# Altium footprint library Standard.PcbLib: 154 footprints (part 1 of 10)
Each footprint in its own frame and in the unit in brackets; x right, y up, seen from the top. Pads: shape width x height; smd on the part's side, far side on the other; paste and mask are expansions set on the pad; w line width, h text height; cw(c..) or ccw(c..) is an arc to the next point about the centre after c.
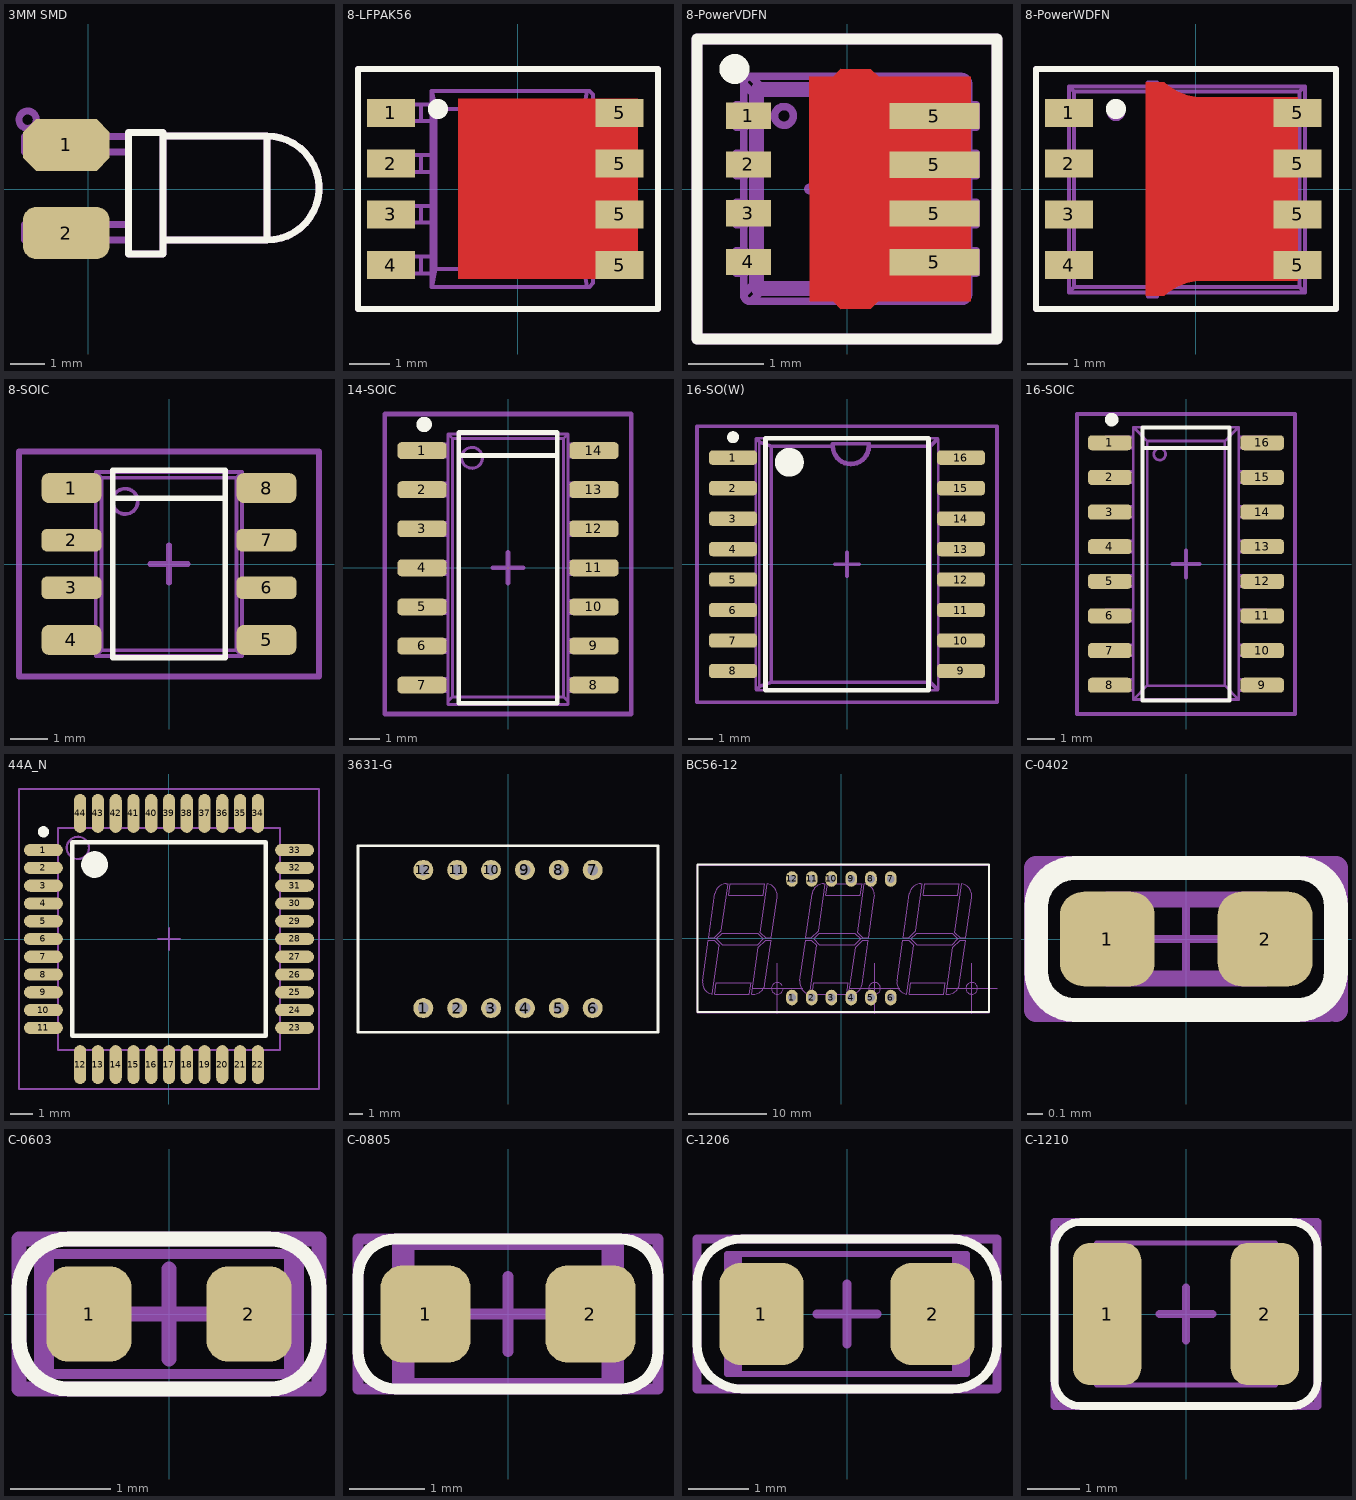
[diagram p0: the footprints below, top view; thin cyan lines are the x and y axes]

## 3MM SMD [mm]
pads (2):
  oct 2.5x1.5 smd: 1(-0.635,1.27)
  rrect50% 2.5x1.5 smd: 2(-0.635,-1.27)
Top Overlay:
  lines w0.2: 2.155,-1.475 5.155,-1.475 ; 2.155,1.525 5.155,1.525 ; 5.155,-1.475 ccw(c5.155,0.025) 5.155,1.525 ; 5.155,-1.475 5.155,1.525 ; 1.155,-1.875 2.155,-1.875 2.155,1.625 1.155,1.625 1.155,-1.875
Top Assembly:
  circle w0.2: c-1.75,2 r0.25
  lines w0.2: 1.155,-1.47 -1.845,-1.47 -1.845,-1.02 1.155,-1.02 ; 1.155,1.07 -1.845,1.07 -1.845,1.52 1.155,1.52 ; 2.155,-1.475 5.155,-1.475 ; 2.155,1.525 5.155,1.525 ; 5.155,-1.475 ccw(c5.155,0.025) 5.155,1.525 ; 5.155,-1.475 5.155,1.525 ; 1.155,-1.875 2.155,-1.875 2.155,1.625 1.155,1.625 1.155,-1.875
3D body "CircuitWorks-LED DIP 3MM.step": height 2.15, standoff -1.65, extent -2,-1.9 6.5,1.6

## 8-LFPAK56 [mm]
pads (8):
  rect 1.2x0.7 smd: 1(-3.175,1.905) 2(-3.175,0.635) 3(-3.175,-0.635) 4(-3.175,-1.905) 5(2.54,-1.905) 5(2.54,-0.635) 5(2.54,0.635) 5(2.54,1.905)
Top Layer:
  region: -1.5,2.25 3,2.25 3,-2.25 -1.5,-2.25
Top Overlay:
  circle w0.4: c-2,2 r0.05
  lines w0.15: -4,-3 3.5,-3 3.5,3 -4,3 -4,-3
Top Assembly:
  circle w0.1: c-0.208,1.503 r0.338
  lines w0.1: 1.877,-1.397 1.877,-2.355 1.785,-2.447 1.73,-2.447 ; 1.877,-0.597 1.877,0.603 ; 1.877,1.403 1.877,2.36 1.785,2.453 1.73,2.453 ; -2.839,-2.112 -2.751,-2.112 ; -2.839,-2.112 -3.208,-2.112 -3.208,-1.692 -2.839,-1.692 ; -2.839,-2.112 -2.839,-1.692 ; -2.839,-1.692 -2.751,-1.692 ; -2.839,-0.842 -2.751,-0.842 ; -2.839,-0.842 -3.208,-0.842 -3.208,-0.422 -2.839,-0.422 ; -2.839,-0.842 -2.839,-0.422 ; -2.839,-0.422 -2.751,-0.422 ; -2.839,0.428 -2.751,0.428 ; -2.839,0.428 -3.208,0.428 -3.208,0.848 -2.839,0.848 ; -2.839,0.428 -2.839,0.848 ; -2.839,0.848 -2.751,0.848 ; -2.839,1.698 -2.751,1.698 ; -2.839,1.698 -3.208,1.698 -3.208,2.118 -2.839,2.118 ; -2.839,1.698 -2.839,2.118 ; -2.839,2.118 -2.751,2.118 ; -2.751,-2.112 -2.714,-2.112 ; -2.751,-2.112 -2.751,-1.692 ; -2.751,-1.692 -2.714,-1.692 ; -2.751,-0.842 -2.714,-0.842 ; -2.751,-0.842 -2.751,-0.422 ; -2.751,-0.422 -2.714,-0.422 ; -2.751,0.428 -2.714,0.428 ; -2.751,0.428 -2.751,0.848 ; -2.751,0.848 -2.714,0.848 ; -2.751,1.698 -2.714,1.698 ; -2.751,1.698 -2.751,2.118 ; -2.751,2.118 -2.714,2.118 ; -2.714,-2.112 -2.424,-2.112 ; -2.714,-2.112 -2.714,-1.692 ; -2.714,-1.692 -2.424,-1.692 ; -2.714,-0.842 -2.424,-0.842 ; -2.714,-0.842 -2.714,-0.422 ; -2.714,-0.422 -2.424,-0.422 ; -2.714,0.428 -2.424,0.428 ; -2.714,0.428 -2.714,0.848 ; -2.714,0.848 -2.424,0.848 ; -2.714,1.698 -2.424,1.698 ; -2.714,1.698 -2.714,2.118 ; -2.714,2.118 -2.424,2.118 ; -2.424,-2.112 -2.158,-2.112 ; -2.424,-2.112 -2.424,-1.692 ; -2.424,-1.692 -2.158,-1.692 ; -2.424,-0.842 -2.158,-0.842 ; -2.424,-0.842 -2.424,-0.422 ; -2.424,-0.422 -2.158,-0.422 ; -2.424,0.428 -2.158,0.428 ; -2.424,0.428 -2.424,0.848 ; -2.424,0.848 -2.158,0.848 ; -2.424,1.698 -2.158,1.698 ; -2.424,1.698 -2.424,2.118 ; -2.424,2.118 -2.158,2.118 ; -2.158,-2.112 -2.158,-2.447 -2.145,-2.447 ; -2.158,-2.112 -2.158,-1.692 ; -2.158,-1.692 -2.158,-0.842 ; -2.158,-0.842 -2.158,-0.422 ; -2.158,-0.422 -2.158,0.428 ; -2.158,0.428 -2.158,0.848 ; -2.158,0.848 -2.158,1.698 ; -2.158,1.698 -2.158,2.118 ; -2.158,2.118 -2.158,2.453 -2.145,2.453 ; -2.145,-2.447 -2.065,-2.001 ; -2.145,-2.447 1.73,-2.447 ; -2.145,2.453 -2.065,2.006 ; -2.145,2.453 1.73,2.453 ; -2.065,-2.001 1.65,-2.001 ; -2.065,-2.001 -2.065,2.006 ; -2.065,2.006 1.65,2.006 ; 1.65,-2.001 1.65,2.006 ; 1.65,-2.001 1.73,-2.447 ; 1.65,2.006 1.73,2.453 ; 1.82,-1.397 1.82,-0.597 1.892,-0.597 1.892,0.603 1.82,0.603 1.82,1.403 2.092,1.403 2.092,2.103 2.342,2.103 2.792,1.653 2.792,-1.647 2.342,-2.097 2.092,-2.097 2.092,-1.397 1.82,-1.397
Top Component Outline:
  lines w0.15: -0.5,0 0.5,0 ; 0,-0.5 0,0.5 ; -4,-3 -4,3 3.5,3 3.5,-3 -4,-3
3D body "User Library-LFPAK-1.step": height 1.1, standoff 0, extent -3.25,-2.45 2.75,2.45

## 8-PowerVDFN [mm]
pads (8):
  rect 0.6x0.35 smd: 1(-1.316,0.977) 2(-1.316,0.327) 3(-1.316,-0.323) 4(-1.316,-0.973)
  rect 1.2x0.35 smd: 5(1.166,-0.977) 5(1.166,-0.327) 5(1.166,0.323) 5(1.166,0.973)
Top Layer:
  region: -0.5,1.5 -0.186,1.5 -0.086,1.6 0.318,1.6 0.417,1.5 1.65,1.5 1.65,-1.5 0.417,-1.5 0.318,-1.6 -0.086,-1.6 -0.187,-1.5 -0.5,-1.5
Top Overlay:
  circle w0.2: c-1.5,1.6 r0.1
  lines w0.15: -2,-2 2,-2 2,2 -2,2 -2,-2
Top Assembly:
  drawing of 483 lines, arcs and shapes, not listed
Top Component Outline:
  lines w0.15: -0.5,0 0.5,0 ; 0,-0.5 0,0.5 ; -2,-2 -2,2 2,2 2,-2 -2,-2
3D body "User Library-DFN8_3x3_0_65Pitch.step": height 0.8, standoff 0, extent -1.465,-1.548 1.735,1.552

## 8-PowerWDFN [mm]
pads (8):
  rect 1.2x0.7 smd: 1(-3.175,1.905) 2(-3.175,0.635) 3(-3.175,-0.635) 4(-3.175,-1.905) 5(2.54,-1.905) 5(2.54,-0.635) 5(2.54,0.635) 5(2.54,1.905)
Top Layer:
  region: -1.25,2.669 -0.792,2.669 -0.691,2.583 -0.467,2.443 -0.221,2.346 0.038,2.297 0.171,2.291 2.549,2.291 2.549,-2.291 0.171,-2.291 0.038,-2.297 -0.221,-2.346 -0.467,-2.443 -0.691,-2.583 -0.792,-2.669 -1.25,-2.669
Top Overlay:
  circle w0.4: c-2,2 r0.05
  lines w0.15: -4,-3 -4,3 3.5,3 3.5,-3 -4,-3
Top Assembly:
  circle w0.254: c-2,1.925 r0.1
  lines w0.1: -3.18,-2.04 -3.305,-2.04 -3.305,-1.79 -3.18,-1.79 ; -3.18,-0.77 -3.305,-0.77 -3.305,-0.52 -3.18,-0.52 ; -3.18,0.5 -3.305,0.5 -3.305,0.75 -3.18,0.75 ; -3.18,1.77 -3.305,1.77 -3.305,2.02 -3.18,2.02 ; -1.205,-2.585 -1.205,-2.685 -0.98,-2.685 -0.98,-2.585 ; -1.205,2.565 -1.205,2.665 -0.98,2.665 -0.98,2.565 ; 2.72,-2.04 2.845,-2.04 2.845,-1.79 2.72,-1.79 ; 2.72,-0.77 2.845,-0.77 2.845,-0.52 2.72,-0.52 ; 2.72,0.5 2.845,0.5 2.845,0.75 2.72,0.75 ; 2.72,1.77 2.845,1.77 2.845,2.02 2.72,2.02 ; -3.18,-2.585 -3.048,-2.453 ; -3.18,-2.585 -3.18,2.565 ; -3.18,-2.585 2.72,-2.585 ; -3.18,2.565 -3.048,2.433 ; -3.18,2.565 2.72,2.565 ; -3.048,-2.453 2.588,-2.453 ; -3.048,-2.453 -3.048,2.433 ; -3.048,2.433 2.588,2.433 ; 2.588,-2.453 2.588,2.433 ; 2.588,-2.453 2.72,-2.585 ; 2.588,2.433 2.72,2.565 ; 2.72,-2.585 2.72,2.565
Top Component Outline:
  lines w0.15: -0.5,0 0.5,0 ; 0,-0.5 0,0.5 ; -4,-3 3.5,-3 3.5,3 -4,3 -4,-3
3D body "User Library-TDSON-8-1.step": height 1, standoff 0, extent -3.329,-2.675 2.821,2.675

## 8-SOIC [mm] "SOIC, 8-Leads, Body 4,90x3,90mm, Pitch 1,27mm, IPC Medium Density"
height 1.75
pads (8):
  rrect50% 1.6x0.8 smd: 1(-2.6,2.025) 4(-2.6,-2.025) 5(2.6,-2.025) 8(2.6,2.025)
  rrect50% 1.6x0.6 smd: 2(-2.6,0.635) 3(-2.6,-0.635) 6(2.6,-0.635) 7(2.6,0.635)
Top Overlay:
  lines w0.15: -1.5,1.75 1.5,1.75 ; -1.5,-2.5 -1.5,2.5 1.5,2.5 1.5,-2.5 -1.5,-2.5
Top Assembly:
  circle w0.1: c-1.17,1.67 r0.338
  lines w0.1: -2.631,-2.115 -2.543,-2.115 ; -2.631,-2.115 -3,-2.115 -3,-1.695 -2.631,-1.695 ; -2.631,-2.115 -2.631,-1.695 ; -2.631,-1.695 -2.543,-1.695 ; -2.631,-0.845 -2.543,-0.845 ; -2.631,-0.845 -3,-0.845 -3,-0.425 -2.631,-0.425 ; -2.631,-0.845 -2.631,-0.425 ; -2.631,-0.425 -2.543,-0.425 ; -2.631,0.425 -2.543,0.425 ; -2.631,0.425 -3,0.425 -3,0.845 -2.631,0.845 ; -2.631,0.425 -2.631,0.845 ; -2.631,0.845 -2.543,0.845 ; -2.631,1.695 -2.543,1.695 ; -2.631,1.695 -3,1.695 -3,2.115 -2.631,2.115 ; -2.631,1.695 -2.631,2.115 ; -2.631,2.115 -2.543,2.115 ; -2.543,-2.115 -2.403,-2.115 ; -2.543,-2.115 -2.543,-1.695 ; -2.543,-1.695 -2.403,-1.695 ; -2.543,-0.845 -2.403,-0.845 ; -2.543,-0.845 -2.543,-0.425 ; -2.543,-0.425 -2.403,-0.425 ; -2.543,0.425 -2.403,0.425 ; -2.543,0.425 -2.543,0.845 ; -2.543,0.845 -2.403,0.845 ; -2.543,1.695 -2.403,1.695 ; -2.543,1.695 -2.543,2.115 ; -2.543,2.115 -2.403,2.115 ; -2.403,-2.115 -2.113,-2.115 ; -2.403,-2.115 -2.403,-1.695 ; -2.403,-1.695 -2.113,-1.695 ; -2.403,-0.845 -2.113,-0.845 ; -2.403,-0.845 -2.403,-0.425 ; -2.403,-0.425 -2.113,-0.425 ; -2.403,0.425 -2.113,0.425 ; -2.403,0.425 -2.403,0.845 ; -2.403,0.845 -2.113,0.845 ; -2.403,1.695 -2.113,1.695 ; -2.403,1.695 -2.403,2.115 ; -2.403,2.115 -2.113,2.115 ; -2.113,-2.115 -1.95,-2.115 ; -2.113,-2.115 -2.113,-1.695 ; -2.113,-1.695 -1.95,-1.695 ; -2.113,-0.845 -1.95,-0.845 ; -2.113,-0.845 -2.113,-0.425 ; -2.113,-0.425 -1.95,-0.425 ; -2.113,0.425 -1.95,0.425 ; -2.113,0.425 -2.113,0.845 ; -2.113,0.845 -1.95,0.845 ; -2.113,1.695 -1.95,1.695 ; -2.113,1.695 -2.113,2.115 ; -2.113,2.115 -1.95,2.115 ; -1.95,-2.45 -1.801,-2.301 ; -1.95,-2.45 -1.95,-2.115 ; -1.95,-2.45 1.95,-2.45 ; -1.95,-2.115 -1.95,-1.695 ; -1.95,-1.695 -1.95,-0.845 ; -1.95,-0.845 -1.95,-0.425 ; -1.95,-0.425 -1.95,0.425 ; -1.95,0.425 -1.95,0.845 ; -1.95,0.845 -1.95,1.695 ; -1.95,1.695 -1.95,2.115 ; -1.95,2.115 -1.95,2.45 ; -1.95,2.45 1.95,2.45 ; -1.95,2.45 -1.801,2.301 ; -1.801,-2.301 -1.801,2.301 ; -1.801,-2.301 1.801,-2.301 ; -1.801,2.301 1.801,2.301 ; 1.801,-2.301 1.801,2.301 ; 1.801,-2.301 1.95,-2.45 ; 1.801,2.301 1.95,2.45 ; 1.95,-2.45 1.95,-2.115 ; 1.95,-2.115 1.95,-1.695 ; 1.95,-2.115 2.113,-2.115 ; 1.95,-1.695 1.95,-0.845 ; 1.95,-1.695 2.113,-1.695 ; 1.95,-0.845 1.95,-0.425 ; 1.95,-0.845 2.113,-0.845 ; 1.95,-0.425 1.95,0.425 ; 1.95,-0.425 2.113,-0.425 ; 1.95,0.425 1.95,0.845 ; 1.95,0.425 2.113,0.425 ; 1.95,0.845 1.95,1.695 ; 1.95,0.845 2.113,0.845 ; 1.95,1.695 1.95,2.115 ; 1.95,1.695 2.113,1.695 ; 1.95,2.115 1.95,2.45 ; 1.95,2.115 2.113,2.115 ; 2.113,-2.115 2.403,-2.115 ; 2.113,-2.115 2.113,-1.695 ; 2.113,-1.695 2.403,-1.695 ; 2.113,-0.845 2.403,-0.845 ; 2.113,-0.845 2.113,-0.425 ; 2.113,-0.425 2.403,-0.425 ; 2.113,0.425 2.403,0.425 ; 2.113,0.425 2.113,0.845 ; 2.113,0.845 2.403,0.845 ; 2.113,1.695 2.403,1.695 ; 2.113,1.695 2.113,2.115 ; 2.113,2.115 2.403,2.115 ; 2.403,-2.115 2.543,-2.115 ; 2.403,-2.115 2.403,-1.695 ; 2.403,-1.695 2.543,-1.695 ; 2.403,-0.845 2.543,-0.845 ; 2.403,-0.845 2.403,-0.425 ; 2.403,-0.425 2.543,-0.425 ; 2.403,0.425 2.543,0.425 ; 2.403,0.425 2.403,0.845 ; 2.403,0.845 2.543,0.845 ; 2.403,1.695 2.543,1.695 ; 2.403,1.695 2.403,2.115 ; 2.403,2.115 2.543,2.115 ; 2.543,-2.115 2.631,-2.115 ; 2.543,-2.115 2.543,-1.695 ; 2.543,-1.695 2.631,-1.695 ; 2.543,-0.845 2.631,-0.845 ; 2.543,-0.845 2.543,-0.425 ; 2.543,-0.425 2.631,-0.425 ; 2.543,0.425 2.631,0.425 ; 2.543,0.425 2.543,0.845 ; 2.543,0.845 2.631,0.845 ; 2.543,1.695 2.631,1.695 ; 2.543,1.695 2.543,2.115 ; 2.543,2.115 2.631,2.115 ; 2.631,-2.115 3,-2.115 3,-1.695 2.631,-1.695 ; 2.631,-2.115 2.631,-1.695 ; 2.631,-0.845 3,-0.845 3,-0.425 2.631,-0.425 ; 2.631,-0.845 2.631,-0.425 ; 2.631,0.425 3,0.425 3,0.845 2.631,0.845 ; 2.631,0.425 2.631,0.845 ; 2.631,1.695 3,1.695 3,2.115 2.631,2.115 ; 2.631,1.695 2.631,2.115
Top Component Outline:
  lines w0.15: -0.5,0 0.5,0 ; 0,-0.5 0,0.5 ; -4,-3 -4,3 4,3 4,-3 -4,-3
3D body "User Library-SOIC-8-1.step": height 1.75, standoff 0, extent -3,-2.45 3,2.45

## 14-SOIC [mm] "SOIC, 14-Leads, Body 8,65x3,90mm, Pitch 1,27mm, IPC Medium Density"
height 1.75
pads (14):
  rrect50% 1.6x0.55 smd: 1(-2.794,3.81) 2(-2.794,2.54) 3(-2.794,1.27) 4(-2.794,0) 5(-2.794,-1.27) 6(-2.794,-2.54) 7(-2.794,-3.81) 8(2.794,-3.81) 9(2.794,-2.54) 10(2.794,-1.27) 11(2.794,0) 12(2.794,1.27) 13(2.794,2.54) 14(2.794,3.81)
Top Overlay:
  circle w0.25: c-2.725,4.66 r0.125
  lines w0.15: -1.6,3.65 1.6,3.65 ; -1.6,-4.4 -1.6,4.4 1.6,4.4 1.6,-4.4 -1.6,-4.4
Top Assembly:
  drawing of 246 lines, arcs and shapes, not listed
Top Component Outline:
  lines w0.15: -0.5,0 0.5,0 ; 0,-0.5 0,0.5 ; -4,-4.75 -4,5 4,5 4,-4.75 -4,-4.75
3D body "User Library-SOIC-14.STEP": height 1.75, standoff 0, extent -3,-4.375 3,4.375

## 16-SO(W) [mm] "SOIC, 16-Leads, Body 10,30x7,50mm, Pitch 1,27mm, IPC Medium Density"
height 2.65
pads (16):
  rrect50% 2x0.6 smd: 1(-4.75,4.445) 2(-4.75,3.175) 3(-4.75,1.905) 4(-4.75,0.635) 5(-4.75,-0.635) 6(-4.75,-1.905) 7(-4.75,-3.175) 8(-4.75,-4.445) 9(4.75,-4.445) 10(4.75,-3.175) 11(4.75,-1.905) 12(4.75,-0.635) 13(4.75,0.635) 14(4.75,1.905) 15(4.75,3.175) 16(4.75,4.445)
Top Overlay:
  circle w0.25: c-4.75,5.295 r0.125
  circle w0.6: c-2.4,4.25 r0.3
  lines w0.2: -3.4,-5.25 -3.4,5.25 3.4,5.25 3.4,-5.25 -3.4,-5.25
Top Assembly:
  drawing of 1172 lines, arcs and shapes, not listed
Top Component Outline:
  lines w0.15: -0.5,0 0.5,0 ; 0,-0.5 0,0.5 ; -6.25,-5.75 -6.25,5.75 6.25,5.75 6.25,-5.75 -6.25,-5.75
3D body "User Library-SOIC16_Wide_JEDEC_MS-013AA.step": height 2.63, standoff -0.02, extent -5.315,-5.25 5.315,5.25

## 16-SOIC [mm] "SOIC, 16-Leads, Body 9,90x3,90mm, Pitch 1,27mm, IPC Medium Density"
height 1.75
pads (16):
  rrect50% 1.6x0.55 smd: 1(-2.794,4.445) 2(-2.794,3.175) 3(-2.794,1.905) 4(-2.794,0.635) 5(-2.794,-0.635) 6(-2.794,-1.905) 7(-2.794,-3.175) 8(-2.794,-4.445) 9(2.794,-4.445) 10(2.794,-3.175) 11(2.794,-1.905) 12(2.794,-0.635) 13(2.794,0.635) 14(2.794,1.905) 15(2.794,3.175) 16(2.794,4.445)
Top Overlay:
  circle w0.25: c-2.725,5.295 r0.125
  lines w0.15: -1.6,4.25 1.6,4.25 ; -1.6,-5 -1.6,5 1.6,5 1.6,-5 -1.6,-5
Top Assembly:
  drawing of 273 lines, arcs and shapes, not listed
Top Component Outline:
  lines w0.15: -0.5,0 0.5,0 ; 0,-0.5 0,0.5 ; -4,-5.5 -4,5.5 4,5.5 4,-5.5 -4,-5.5
3D body "CircuitWorks-SO-16.step": height 1.45, standoff 0, extent -2.921,-4.991 2.984,4.991

## 44A_N [mm]
pads (44):
  oval 1.75x0.55 smd: 1(-5.65,4) 2(-5.65,3.2) 3(-5.65,2.4) 4(-5.65,1.6) 5(-5.65,0.8) 6(-5.65,0) 7(-5.65,-0.8) 8(-5.65,-1.6) 9(-5.65,-2.4) 10(-5.65,-3.2) 11(-5.65,-4) 23(5.65,-4) 24(5.65,-3.2) 25(5.65,-2.4) 26(5.65,-1.6) 27(5.65,-0.8) 28(5.65,0) 29(5.65,0.8) 30(5.65,1.6) 31(5.65,2.4) 32(5.65,3.2) 33(5.65,4)
  oval 0.55x1.75 smd: 12(-4,-5.65) 13(-3.2,-5.65) 14(-2.4,-5.65) 15(-1.6,-5.65) 16(-0.8,-5.65) 17(0,-5.65) 18(0.8,-5.65) 19(1.6,-5.65) 20(2.4,-5.65) 21(3.2,-5.65) 22(4,-5.65) 34(4,5.65) 35(3.2,5.65) 36(2.4,5.65) 37(1.6,5.65) 38(0.8,5.65) 39(0,5.65) 40(-0.8,5.65) 41(-1.6,5.65) 42(-2.4,5.65) 43(-3.2,5.65) 44(-4,5.65)
Top Overlay:
  circle w0.25: c-5.65,4.825 r0.125
  circle w0.6: c-3.35,3.35 r0.3
  lines w0.2: -4.35,-4.35 -4.35,4.35 4.35,4.35 4.35,-4.35 -4.35,-4.35
Top Assembly:
  circle w0.1: c-4.1,4.1 r0.5
  lines w0.1: -5,-5 -5,5 5,5 5,-5 -5,-5
Top Component Outline:
  lines w0.1: -0.5,0 0.5,0 ; 0,-0.5 0,0.5 ; -6.75,-6.75 -6.75,6.75 6.75,6.75 6.75,-6.75 -6.75,-6.75
3D body "User Library-TQFP44-1.STEP": height 1.1, standoff 0, extent -6.009,-5.969 6.009,6.049

## 3631-G [mm]
pads (12):
  round 1.5 hole 0.8: 1(-6.35,-5.18) 2(-3.81,-5.18) 3(-1.27,-5.18) 4(1.27,-5.18) 5(3.81,-5.18) 6(6.35,-5.18) 7(6.35,5.18) 8(3.81,5.18) 9(1.27,5.18) 10(-1.27,5.18) 11(-3.81,5.18) 12(-6.35,5.18)
Top Overlay:
  lines w0.2: -11.25,-7 11.25,-7 11.25,7 -11.25,7 -11.25,-7
Top Assembly:
  lines w0.1: -11.25,-7 -11.25,7 11.25,7 11.25,-7 -11.25,-7
Top Component Outline:
  lines w0.127: -11.25,-7 11.25,-7 11.25,7 -11.25,7 -11.25,-7
3D body "User Library-3631_Green_jam.STEP": height 7.15, standoff -5.45, extent -11.2,-7 11.2,7

## BC56-12 [mm]
pads (12):
  oval 1.5x2 hole 1: 1(-6.35,-7.62) 2(-3.81,-7.62) 3(-1.27,-7.62) 4(1.27,-7.62) 5(3.81,-7.62) 6(6.35,-7.62) 7(6.35,7.62) 8(3.81,7.62) 9(1.27,7.62) 10(-1.27,7.62) 11(-3.81,7.62) 12(-6.35,7.62)
Top Overlay:
  lines w0.254: -18.5,-9.5 19,-9.5 19,9.5 -18.5,9.5 -18.5,-9.5
Top Assembly:
  circle w0.1: c16.77,-6.44 r0.75
  circle w0.1: c4.27,-6.44 r0.75
  lines w0.1: -11.48,-6.44 -10.73,-6.44 -8.23,-6.44 ; -8.23,-9.69 -8.23,-8.94 -8.23,-6.44 ; -8.23,-3.19 -8.23,-3.94 -8.23,-6.44 ; -7.559,-6.105 ccw(c-8.23,-6.44) -7.48,-6.44 ; -4.98,-6.44 -5.73,-6.44 -8.23,-6.44 ; 1.02,-6.44 1.77,-6.44 4.27,-6.44 ; 4.27,-9.69 4.27,-8.94 4.27,-6.44 ; 4.27,-3.19 4.27,-3.94 4.27,-6.44 ; 7.52,-6.44 6.77,-6.44 4.27,-6.44 ; 13.52,-6.44 14.27,-6.44 16.77,-6.44 ; 16.77,-9.69 16.77,-8.94 16.77,-6.44 ; 16.77,-3.19 16.77,-3.94 16.77,-6.44 ; 20.02,-6.44 19.27,-6.44 16.77,-6.44 ; -18.552,-9.59 -18.552,9.41 19.048,9.41 19.048,-9.59 -18.552,-9.59 ; -17.836,-5.481 ccw(c-16.351,-5.69) -16.56,-7.175 -15.678,-0.905 -16.343,-0.24 -17.1,-0.24 -17.836,-5.481 ; -17.057,0.06 -16.262,5.719 cw(c-14.777,5.51) -14.777,7.01 -14.566,7.01 -15.412,0.991 -16.343,0.06 -17.057,0.06 ; -16.259,-7.19 -16.048,-5.69 -11.605,-5.69 -11.815,-7.19 -16.259,-7.19 ; -16.069,-0.09 -15.319,0.66 -10.76,0.66 -10.01,-0.09 -10.76,-0.84 -15.319,-0.84 -16.069,-0.09 ; -14.474,5.51 -14.263,7.01 -9.82,7.01 -10.031,5.51 -14.474,5.51 ; -11.512,-7.19 -10.667,-1.171 -9.735,-0.24 -9.021,-0.24 -9.816,-5.899 cw(c-11.302,-5.69) -11.302,-7.19 -11.512,-7.19 ; -10.4,0.725 -9.519,6.995 cw(c-9.728,5.51) -8.242,5.301 -8.979,0.06 -9.735,0.06 -10.4,0.725 ; -5.336,-5.481 ccw(c-3.851,-5.69) -4.06,-7.175 -3.178,-0.905 -3.843,-0.24 -4.6,-0.24 -5.336,-5.481 ; -4.557,0.06 -3.762,5.719 cw(c-2.277,5.51) -2.277,7.01 -2.066,7.01 -2.912,0.991 -3.843,0.06 -4.557,0.06 ; -3.759,-7.19 -3.548,-5.69 0.895,-5.69 0.685,-7.19 -3.759,-7.19 ; -3.569,-0.09 -2.819,0.66 1.74,0.66 2.49,-0.09 1.74,-0.84 -2.819,-0.84 -3.569,-0.09 ; -1.974,5.51 -1.763,7.01 2.68,7.01 2.469,5.51 -1.974,5.51 ; 0.988,-7.19 1.833,-1.171 2.765,-0.24 3.479,-0.24 2.684,-5.899 cw(c1.198,-5.69) 1.198,-7.19 0.988,-7.19 ; 2.1,0.725 2.981,6.995 cw(c2.772,5.51) 4.258,5.301 3.521,0.06 2.765,0.06 2.1,0.725 ; 7.164,-5.481 ccw(c8.649,-5.69) 8.44,-7.175 9.322,-0.905 8.657,-0.24 7.9,-0.24 7.164,-5.481 ; 7.943,0.06 8.738,5.719 cw(c10.223,5.51) 10.223,7.01 10.434,7.01 9.588,0.991 8.657,0.06 7.943,0.06 ; 8.741,-7.19 8.952,-5.69 13.395,-5.69 13.185,-7.19 8.741,-7.19 ; 8.931,-0.09 9.681,0.66 14.24,0.66 14.99,-0.09 14.24,-0.84 9.681,-0.84 8.931,-0.09 ; 10.526,5.51 10.737,7.01 15.18,7.01 14.969,5.51 10.526,5.51 ; 13.488,-7.19 14.333,-1.171 15.265,-0.24 15.979,-0.24 15.184,-5.899 cw(c13.698,-5.69) 13.698,-7.19 13.488,-7.19 ; 14.6,0.725 15.481,6.995 cw(c15.272,5.51) 16.758,5.301 16.021,0.06 15.265,0.06 14.6,0.725
3D body "end-el-san Co Ltd-King Bright BX56-12A.step": height 8, standoff -4.1, extent -18.53,-9.44 19.07,9.56

## C-0402 [mm] "Chip Capacitor, 2-Leads, Body 1,60x0,83mm, IPC Medium Density"
height 0.6
pads (2):
  rrect50% 0.6x0.6 smd: 1(-0.5,0) 2(0.5,0)
Top Overlay:
  lines w0.15: -0.707,-0.449 cw(c-0.707,-0.207) -0.949,-0.207 -0.949,0.207 cw(c-0.707,0.207) -0.707,0.449 ; -0.695,-0.45 0.707,-0.45 ccw(c0.707,-0.207) 0.949,-0.207 0.949,0.207 ccw(c0.707,0.207) 0.707,0.449 ; -0.695,0.45 0.695,0.45
Top Assembly:
  lines w0.1: -0.5,-0.25 -0.5,0.25 0.5,0.25 0.5,-0.25 -0.5,-0.25
Top Component Outline:
  lines w0.05: -0.25,0 0.25,0 ; 0,-0.25 0,0.25
  lines w0.15: -0.951,-0.45 -0.951,0.45 0.949,0.45 0.949,-0.45 ; -0.926,-0.45 0.899,-0.45
3D body "CAPC-0402-T0.55-BN.stp": height 0.55, standoff 0, extent -0.525,-0.275 0.525,0.275

## C-0603 [mm] "Chip Capacitor, 2-Leads, Body 1,60x0,83mm, IPC Medium Density"
height 0.6
pads (2):
  rrect50% 0.85x0.95 smd: 1(-0.8,0) 2(0.8,0)
Top Overlay:
  lines w0.15: -1.5,-0.25 ccw(c-1,-0.25) -1,-0.75 1,-0.75 ccw(c1,-0.25) 1.5,-0.25 1.5,0.25 ccw(c1,0.25) 1,0.75 -1,0.75 ccw(c-1,0.25) -1.5,0.25 -1.5,-0.25
Top Assembly:
  lines w0.1: -1.2,-0.6 -1.2,0.6 ; 1.2,-0.6 1.2,0.6 ; -1.3,-0.6 -1.3,0.6 1.3,0.6 1.3,-0.6 -1.3,-0.6
Top Component Outline:
  lines w0.15: -0.45,0 0.45,0 ; 0,-0.45 0,0.45 ; -1.5,-0.75 -1.5,0.75 1.5,0.75 1.5,-0.75 -1.5,-0.75
3D body "CAPC-0603-T0.9-BN.stp": height 0.9, standoff 0, extent -0.85,-0.45 0.85,0.45

## C-0805 [mm] "Chip Capasitor, 2-Leads, Body 2,00x1,25mm, IPC Medium Density"
height 0.7
pads (2):
  rrect50% 1.2x1.3 smd: 1(-1.1,0) 2(1.1,0)
Top Overlay:
  lines w0.15: -2,-0.5 ccw(c-1.5,-0.5) -1.5,-1 1.5,-1 ccw(c1.5,-0.5) 2,-0.5 2,0.5 ccw(c1.5,0.5) 1.5,1 -1.5,1 ccw(c-1.5,0.5) -2,0.5 -2,-0.5
Top Assembly:
  rectangle: -1.5,-0.9 -1.3,0.9
  rectangle: 1.3,-0.9 1.5,0.9
  lines w0.1: -1.3,-0.9 -1.3,0.9 ; 1.3,-0.9 1.3,0.9 ; -1.5,-0.9 -1.5,0.9 1.5,0.9 1.5,-0.9 -1.5,-0.9
Top Component Outline:
  lines w0.15: -0.5,0 0.5,0 ; 0,-0.5 0,0.5 ; -2,-1 -2,1 2,1 2,-1 -2,-1
3D body "CAPC-0805-T0.95-BN.stp": height 0.95, standoff 0, extent -1.05,-0.675 1.05,0.675

## C-1206 [mm] "Chip Capasitor, 2-Leads, Body 3,20x1,60mm, IPC Medium Density"
height 0.7
pads (2):
  rrect50% 1.4x1.7 smd: 1(-1.425,0) 2(1.425,0)
Top Overlay:
  lines w0.15: -2.5,-0.5 ccw(c-1.75,-0.5) -1.75,-1.25 1.75,-1.25 ccw(c1.75,-0.5) 2.5,-0.5 2.5,0.5 ccw(c1.75,0.5) 1.75,1.25 -1.75,1.25 ccw(c-1.75,0.5) -2.5,0.5 -2.5,-0.5
Top Assembly:
  rectangle: 1.75,-1.05 1.95,1
  rectangle: -1.95,-1 -1.75,1
  lines w0.1: -2,-1 2,-1 2,1 -2,1 -2,-1
Top Component Outline:
  lines w0.15: -0.5,0 0.5,0 ; 0,-0.5 0,0.5 ; -2.5,-1.25 2.5,-1.25 2.5,1.25 -2.5,1.25 -2.5,-1.25
3D body "CAPC-1206-T1.75-BN.stp": height 1.75, standoff 0, extent -1.675,-0.875 1.675,0.875

## C-1210 [mm] "Chip Capacitor, Body 3.2x2.5mm, IPC Medium Density"
height 1.35
pads (2):
  rrect50% 1.3x2.7 smd: 1(-1.5,0) 2(1.5,0)
Top Overlay:
  lines w0.15: -2.5,-1.25 ccw(c-2,-1.25) -2,-1.75 0,-1.75 2,-1.75 ccw(c2,-1.25) 2.5,-1.25 2.5,1.25 ccw(c2,1.25) 2,1.75 0,1.75 -2,1.75 ccw(c-2,1.25) -2.5,1.25 -2.5,-1.25
Top Assembly:
  lines w0.1: -1.7,-1.35 1.7,-1.35 1.7,1.35 -1.7,1.35 -1.7,-1.35
Top Component Outline:
  lines w0.15: -0.5,0 0.5,0 ; 0,-0.5 0,0.5 ; -2.5,-1.75 2.5,-1.75 2.5,1.75 -2.5,1.75 -2.5,-1.75
3D body "CAPC-1210-T2.2-BN.stp": height 2.2, standoff 0, extent -1.75,-1.35 1.75,1.35